# Altium footprint library altium_parts_templates_PCB.PcbLib: 93 footprints (part 4 of 6)
Each footprint in its own frame and in the unit in brackets; x right, y up, seen from the top. Pads: shape width x height; smd on the part's side, far side on the other; paste and mask are expansions set on the pad; w line width, h text height; cw(c..) or ccw(c..) is an arc to the next point about the centre after c.
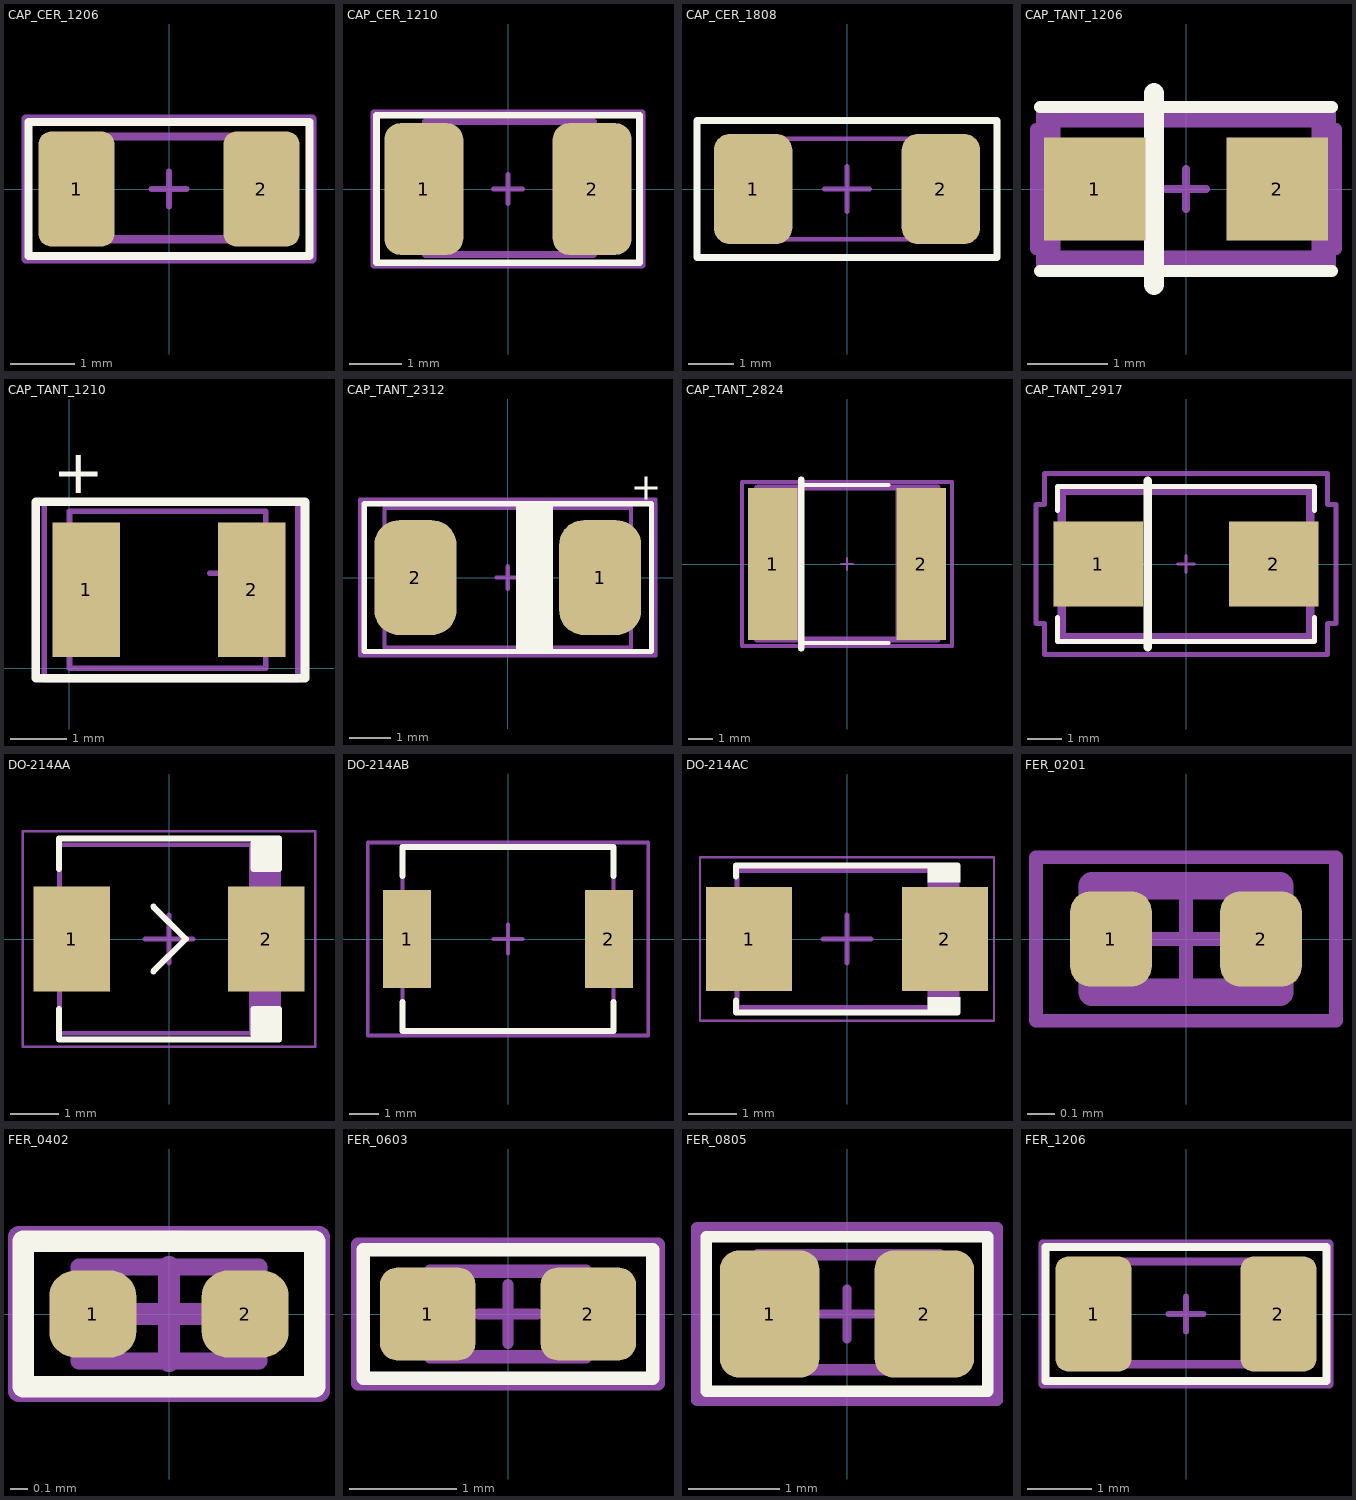
[diagram p3: the footprints below, top view; thin cyan lines are the x and y axes]

## CAP_CER_1206 [mil] "Ceramic Capacitor - 1206"
height 62.99
pads (2):
  rrect34% 47x71 smd paste+0 mask+1.97: 1(-57,0) 2(57,0)
Top Overlay:
  lines w5: -86.61,-41.34 86.61,-41.34 86.61,41.34 -86.61,41.34 -86.61,-41.34
Top Assembly Drawing:
  lines w5: -62.99,-30.99 -62.99,32.48 63.98,32.48 63.98,-30.99 -62.99,-30.99
Top Courtyard:
  lines w3.94: -10.83,0 10.83,0 ; 0,-10.83 0,10.83
  lines w5: -88.58,-43.31 88.58,-43.31 88.58,43.31 -88.58,43.31 -88.58,-43.31
3D body "Cap1206.step": height 49.21, standoff 0, extent -61.98,-30.99 64,32

## CAP_CER_1210 [mm] "Ceramic Capacitor - 1210"
height 2.5
pads (2):
  rrect40% 1.5x2.5 smd paste+0 mask+0.05: 1(-1.6,0) 2(1.6,0)
Top Overlay:
  lines w0.127: -2.5,-1.4 2.5,-1.4 2.5,1.4 -2.5,1.4 -2.5,-1.4
Top Assembly Drawing:
  lines w0.127: -1.575,-1.245 -1.575,1.275 1.625,1.275 1.625,-1.245 -1.575,-1.245
Top Courtyard:
  lines w0.1: -0.275,0 0.275,0 ; 0,-0.275 0,0.275
  lines w0.127: -2.55,-1.45 -2.55,1.45 2.55,1.45 2.55,-1.45 -2.55,-1.45
3D body "cap1210.step": height 2.5, standoff 0, extent -1.575,-1.245 1.625,1.255

## CAP_CER_1808 [mm] "Chip Capacitor, 2-Leads, Body 4,60x2,00mm, IPC Medium Density"
height 2.2
pads (2):
  rrect40% 1.71x2.4 smd paste-0.025 mask+0.07: 1(-2.05,0) 2(2.05,0)
Top Overlay:
  lines w0.152: -3.275,-1.5 -3.275,1.5 3.275,1.5 3.275,-1.5 -3.275,-1.5
Top Assembly Drawing:
  lines w0.1: -2.55,-1.1 2.55,-1.1 2.55,1.1 -2.55,1.1 -2.55,-1.1
Top Courtyard:
  lines w0.05: -3.275,-1.5 3.275,-1.5 3.275,1.5 -3.275,1.5 -3.275,-1.5
  lines w0.1: -0.5,0 0.5,0 ; 0,-0.5 0,0.5
3D body "CAPC4620X22N.step": height 2.2, standoff 0, extent -2.55,-1.1 2.55,1.1

## CAP_TANT_1206 [mil]
pads (2):
  rect 50x51 smd paste+0 mask+0: 1(-45,0) 2(45,0)
Top Overlay:
  lines w6: -72,-40.5 72,-40.5 ; -72,40.5 72,40.5
  lines w10: -15.75,-47.24 -15.75,47.24
Top Assembly Drawing:
  lines w10: -66.93,-35.43 -66.93,35.43 66.93,35.43 66.93,-35.43 -66.93,-35.43
Top 3D Model:
  circle w0: c-57,0 r3
  lines w1: -67,-35.5 -67,35.5 67,35.5 67,-35.5 -67,-35.5
Top Courtyard:
  lines w3.94: -9.84,0 9.84,0 ; 0,-9.84 0,9.84
  lines w6: -74,-29.5 -71,-29.5 -71,-39.5 71,-39.5 71,-29.5 74,-29.5 74,29.5 71,29.5 71,39.5 -71,39.5 -71,29.5 -74,29.5 -74,-29.5
3D body "F93-A.stp": height 72.99, standoff 0, extent -67,-35.5 67.01,35.52

## CAP_TANT_1210 [mm] "Cap Tantalum 7.3mm - 4.3mm"
height 31
pads (2):
  rect 1.2x2.4 smd: 1(0.3,1.4) 2(3.25,1.4)
Top Overlay:
  lines w0.152: -0.6,-0.175 4.2,-0.175 4.2,2.975 4.05,2.975 -0.6,2.975 -0.6,-0.175
  text "+" at -0.3,3.125 h0.8
Top 3D Model:
  lines w0.1: 0,0 0,2.8 3.5,2.8 3.5,0 0,0
Top Courtyard:
  lines w0.1: 2.5,1.7 3.5,1.7 ; 3,1.2 3,2.2 ; -0.45,-0.2 -0.45,2.975 4.075,2.975 4.075,-0.2 -0.45,-0.2
3D body: height 2.9, standoff 0, extent 0,0 3.5,2.8
3D body: height 1.2, standoff 0, extent -0.175,0.225 0.325,2.625
3D body: height 1.2, standoff 0, extent 3.2,0.2 3.7,2.6
3D body: height 2.91, standoff 2.9, extent 0,0 0.625,2.8

## CAP_TANT_2312 [mm] "Tantalum Capacitor  - Case C (AVX)"
height 2.6
pads (2):
  rrect60% 2x2.8 smd paste+0 mask+0.05: 1(2.25,0) 2(-2.25,0)
Top Overlay:
  rectangle: 0.2,-1.8 1.1,1.8
  lines w0.127: -3.5,-1.8 3.5,-1.8 3.5,1.8 -3.5,1.8 -3.5,-1.8
  text "+" at 3,1.9 h0.66
Top Assembly Drawing:
  lines w0.1: -3,-1.7 3,-1.7 3,1.7 -3,1.7 -3,-1.7
Top Courtyard:
  lines w0.1: -0.275,0 0.275,0 ; 0,-0.275 0,0.275 ; -3.6,-1.9 -3.6,1.9 3.6,1.9 3.6,-1.9 -3.6,-1.9
3D body "User Library-AVX_C_CASE.step": height 2.7, standoff 0, extent -3.05,-1.675 3.05,1.675

## CAP_TANT_2824 [mil]
pads (2):
  rect 81x248 smd paste+0 mask+0: 1(-121,0) 2(121,0)
Top Overlay:
  lines w6: -68.39,-129 68.39,-129 ; -68.39,129 68.39,129
  lines w10: -74.8,-137.8 -74.8,137.8
Top Assembly Drawing:
  lines w10: 147.64,-123.03 -146.65,-123.03 -146.65,124.02 -145.67,125 147.64,125 147.64,-123.03 ; 147.64,-123.03 147.64,-123.03
Top 3D Model:
  circle w0: c-116,0 r3
  lines w1: -147.5,-124 -147.5,124 ; -147.5,-124 -80.5,-124 -80.5,124 -147.5,124 ; -147.5,-124 147.5,-124 ; -147.5,-124 -147.5,124 ; -147.5,124 147.5,124 ; 147.5,-124 80.5,-124 80.5,124 147.5,124 ; 147.5,-124 147.5,124 ; 147.5,-124 147.5,124
Top Courtyard:
  lines w3.94: -9.85,0 9.84,0 ; 0,-9.85 0,9.84
  lines w6: -171.5,-134 -171.5,134 171.5,134 171.5,-134 -171.5,-134
3D body "T495E157K020ATE080.step": height -16.19, standoff -165.84, extent -149.61,-124.02 149.61,124.02
3D body: height 10, standoff 0, extent -147.64,-124.02 147.64,124.02

## CAP_TANT_2917 [mil]
pads (2):
  rect 104x98 smd paste+0 mask+0: 1(-101.5,0) 2(101.5,0)
Top Overlay:
  lines w6: -148.5,-62.1 -148.5,-89.5 148.5,-89.5 148.5,-62.1 ; -148.5,62.1 -148.5,89.5 148.5,89.5 148.5,62.1
  lines w10: -44.29,-96.46 -44.29,96.46
Top Assembly Drawing:
  lines w10: -143.7,-83.66 -143.7,84.65 143.7,84.65 143.7,-84.65 -142.72,-84.65 -143.7,-83.66
Top 3D Model:
  lines w1: -143.5,-84.5 143.5,-84.5 143.5,84.5 -143.5,84.5 -143.5,-84.5
Top Courtyard:
  lines w3.94: -9.84,0 9.84,0 ; 0,-9.84 0,9.84
  lines w6: -173.5,-69 -173.5,69 -163.5,69 -163.5,104.5 163.5,104.5 163.5,69 173.5,69 173.5,-69 163.5,-69 163.5,-104.5 -163.5,-104.5 -163.5,-69 -173.5,-69
3D body: height 10, standoff 0, extent 0,0 10,10
3D body "PCAP7343-31_Kemet.stp": height 124.02, standoff 0, extent -143.5,-84.48 143.51,84.5

## DO-214AA [mm] "DO-214AA, SMB"
height 2.44
pads (2):
  rect 1.6x2.2 smd paste-0.025 mask+0.07: 1(-2.032,0) 2(2.032,0)
Top Overlay:
  rectangle: 1.763,-2.1 2.3,-1.463
  rectangle: 1.763,1.463 2.3,2.1
  lines w0.127: -2.3,-1.463 -2.3,-2.1 2.3,-2.1 2.3,-1.463 1.763,-1.463 1.763,-2 ; -2.3,1.463 -2.3,2.1 2.3,2.1 2.3,1.463 1.763,1.463 1.763,2 ; -0.325,-0.675 0.35,0 -0.325,0.675
Top Assembly Drawing:
  region: 2.285,1.97 1.67,1.97 1.67,-1.97 2.285,-1.97
  lines w0.1: -2.285,-1.97 2.285,-1.97 2.285,1.97 -2.285,1.97 -2.285,-1.97
Top Courtyard:
  lines w0.05: -3.05,-2.25 3.05,-2.25 3.05,2.25 -3.05,2.25 -3.05,-2.25
  lines w0.1: -0.5,0 0.5,0 ; 0,-0.5 0,0.5
3D body "CAPM3216X18N.step": height 2.44, standoff 0, extent -2.505,-1.97 2.505,1.97

## DO-214AB [mm] "DO-214AB, SMC"
height 2.62
pads (2):
  rect 1.6x3.3 smd paste-0.025 mask+0.07: 1(-3.4,0) 2(3.4,0)
Top Overlay:
  lines w0.2: -3.55,-2.125 -3.55,-3.1 3.55,-3.1 3.55,-2.125 ; -3.55,2.125 -3.55,3.1 3.55,3.1 3.55,2.125
Top Assembly Drawing:
  lines w0.127: -3.555,-3.11 -3.555,3.11 3.555,3.11 3.555,-3.11 -3.555,-3.11
Top Courtyard:
  lines w0.127: -0.5,0 0.5,0 ; 0,-0.5 0,0.5 ; -4.725,-3.25 -4.725,3.25 4.725,3.25 4.725,-3.25 -4.725,-3.25
3D body: height 2.62, standoff 0, extent -3.555,-3.11 3.555,3.11

## DO-214AC [mil] "DO-214AC, SMA"
height 116.14
pads (2):
  rect 70x85 smd paste-0.98 mask+2.76: 1(-80,0) 2(80,0)
Top Overlay:
  rectangle: 65.94,-60.04 92.52,-47.24
  rectangle: 65.94,46.26 92.52,60.04
  lines w5: -90.55,-50.2 -90.55,-60 90,-60 ; -90.55,51.18 -90.55,60.04 ; -90.55,60 90,60.04
Top Assembly Drawing:
  rectangle: 65.76,-55.91 89.96,55.91
  lines w3.94: -89.96,-55.91 89.96,-55.91 89.96,55.91 -89.96,55.91 -89.96,-55.91
Top Courtyard:
  lines w1.97: -120.08,-66.93 120.08,-66.93 120.08,66.93 -120.08,66.93 -120.08,-66.93
  lines w3.94: -19.68,0 19.68,0 ; 0,-19.68 0,19.68
3D body "CAPM3216X18N.step": height 116.14, standoff 0, extent -98.62,-55.91 98.62,55.91

## FER_0201 [mm] "Ferrite 0201"
height 0.4
pads (2):
  rrect50% 0.3x0.35 smd paste+0 mask+0.02: 1(-0.275,0) 2(0.275,0)
Top Assembly Drawing:
  lines w0.1: -0.345,-0.195 0.345,-0.195 0.345,0.195 -0.345,0.195 -0.345,-0.195
Top Courtyard:
  lines w0.05: -0.195,0 0.195,0 ; 0,-0.195 0,0.195 ; -0.55,-0.3 -0.55,0.3 0.55,0.3 0.55,-0.3 -0.55,-0.3
3D body "44025.stp": height 0.29, standoff -0.01, extent -0.3,-0.15 0.3,0.15

## FER_0402 [mil] "Ferrite - 0402"
height 23.62
pads (2):
  rrect60% 20x20 smd paste+0 mask+1.97: 1(-17.5,0) 2(17.5,0)
Top Overlay:
  lines w5: -33.46,-16.73 -33.46,16.73 33.46,16.73 33.46,-16.73 -33.46,-16.73
Top Assembly Drawing:
  lines w3.94: -20.67,-10.83 -20.67,10.83 20.67,10.83 20.67,-10.83 -20.67,-10.83
Top Courtyard:
  lines w5: -10.83,0 10.83,0 ; 0,-10.83 0,10.83 ; -34.45,-17.72 34.45,-17.72 34.45,17.72 -34.45,17.72 -34.45,-17.72
3D body "44278.stp": height 19.29, standoff -0.39, extent -19.69,-9.84 19.68,9.84

## FER_0603 [mil] "Ferrite - 0603"
height 31.5
pads (2):
  rrect35% 35x34 smd paste+0 mask+1.97: 1(-29.5,0) 2(29.5,0)
Top Overlay:
  lines w5: -53.15,-23.62 53.15,-23.62 53.15,23.62 -53.15,23.62 -53.15,-23.62
Top Assembly Drawing:
  lines w5: -28.54,-15.75 28.54,-15.75 28.54,15.75 -28.54,15.75 -28.54,-15.75
Top Courtyard:
  lines w3.94: -10.83,0 10.83,0 ; 0,-10.83 0,10.83
  lines w5: -55.12,-25.59 55.12,-25.59 55.12,25.59 -55.12,25.59 -55.12,-25.59
3D body "44212.stp": height 31.5, standoff 0, extent -31.49,-15.75 31.5,15.75

## FER_0805 [mil] "Ferrite - 0805"
height 49.21
pads (2):
  rrect37% 43x55 smd paste+0 mask+1.97: 1(-33.5,0) 2(33.5,0)
Top Overlay:
  lines w5: -61.02,-33.46 -61.02,33.46 61.02,33.46 61.02,-33.46 -61.02,-33.46
Top Assembly Drawing:
  lines w5: -38.74,-24.21 40,-24.21 40,25.59 -38.74,25.59 -38.74,-24.21
Top Courtyard:
  lines w3.94: -10.83,0 10.83,0 ; 0,-10.83 0,10.83
  lines w5: -64.96,-37.4 -64.96,37.4 64.96,37.4 64.96,-37.4 -64.96,-37.4
3D body "44133.stp": height 35.43, standoff 0, extent -39.36,-23.62 39.38,23.62

## FER_1206 [mil] "Ferrite - 1206"
height 62.99
pads (2):
  rrect34% 47x71 smd paste+0 mask+1.97: 1(-57,0) 2(57,0)
Top Overlay:
  lines w5: -86.61,-41.34 -86.61,41.34 86.61,41.34 86.61,-41.34 -86.61,-41.34
Top Assembly Drawing:
  lines w5: -62.99,-30.99 63.98,-30.99 63.98,32.48 -62.99,32.48 -62.99,-30.99
Top Courtyard:
  lines w3.94: -10.83,0 10.83,0 ; 0,-10.83 0,10.83
  lines w5: -88.58,-43.31 -88.58,43.31 88.58,43.31 88.58,-43.31 -88.58,-43.31
3D body "44184.stp": height 43.31, standoff 0, extent -62.99,-31.5 63,31.5